# Altium footprint library 6.Transistors&Chips.PcbLib: 88 footprints (part 2 of 6)
Each footprint in its own frame and in the unit in brackets; x right, y up, seen from the top. Pads: shape width x height; smd on the part's side, far side on the other; paste and mask are expansions set on the pad; w line width, h text height; cw(c..) or ccw(c..) is an arc to the next point about the centre after c.
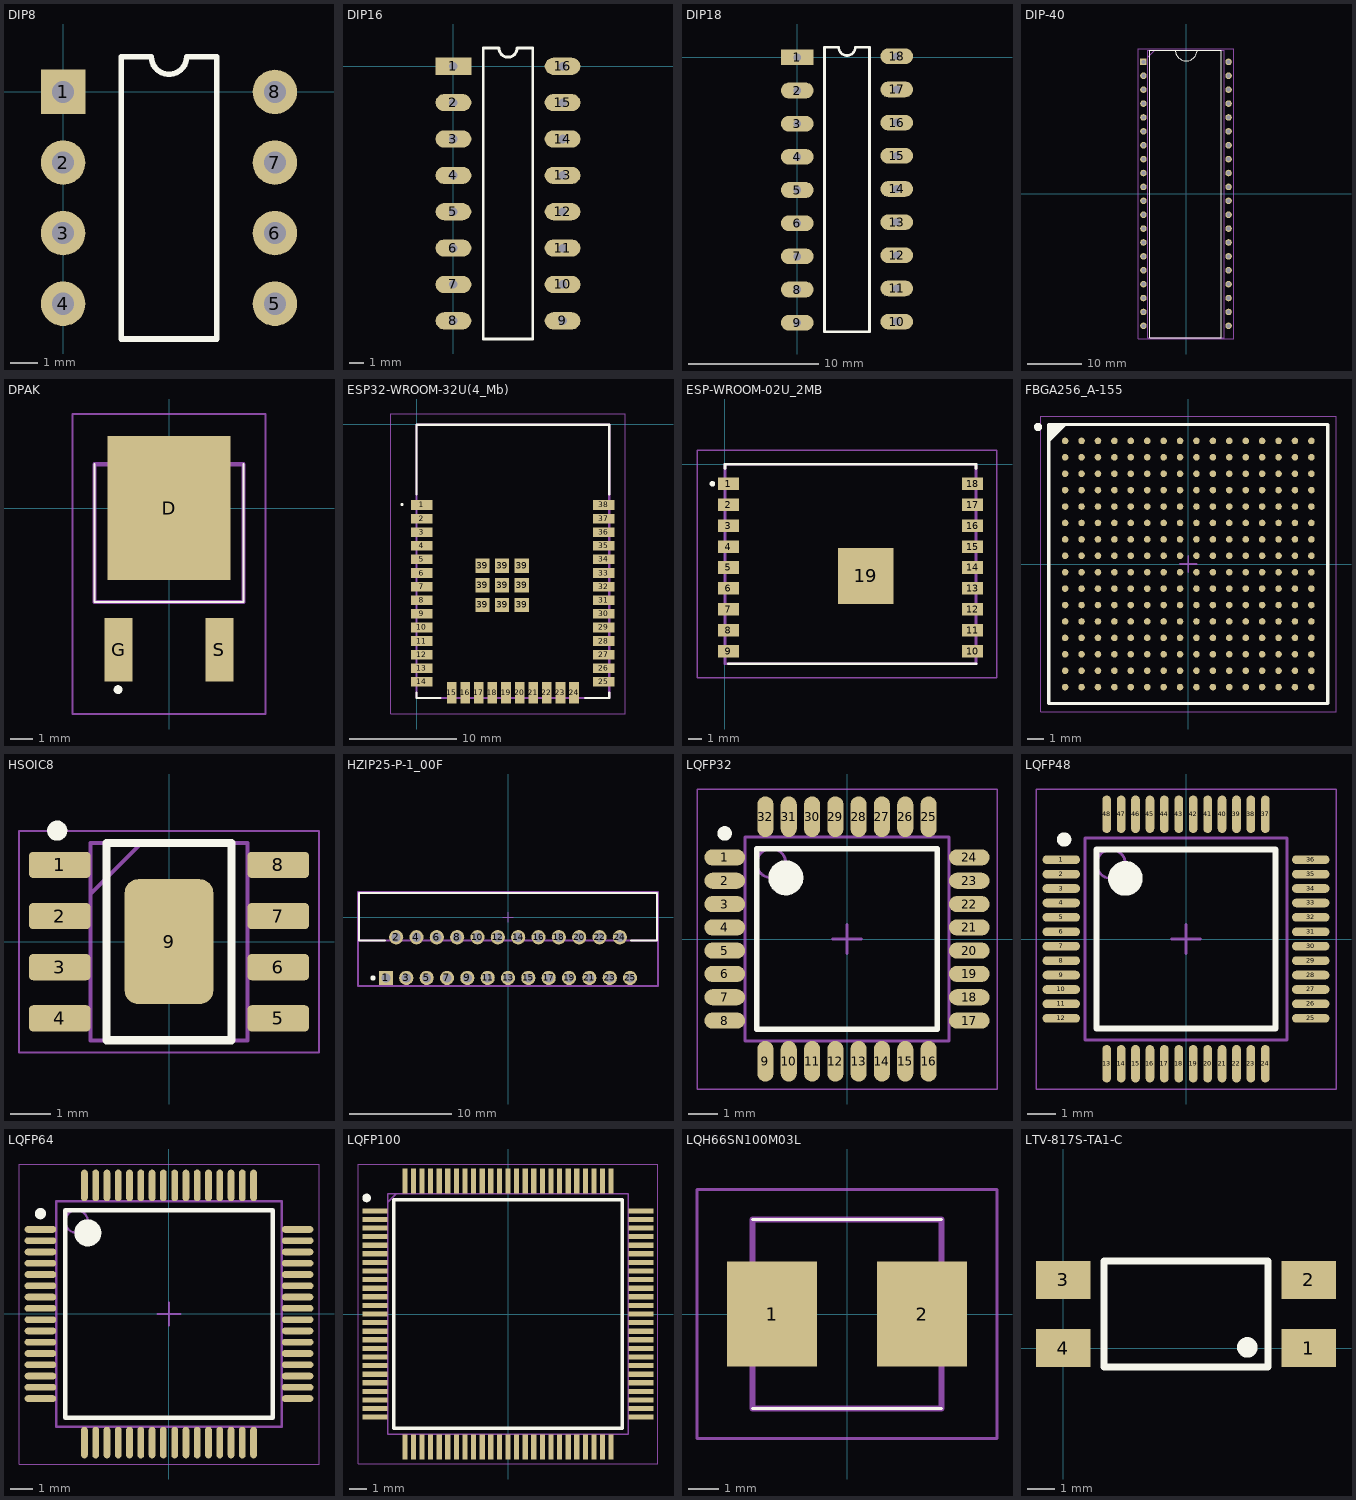
[diagram p1: the footprints below, top view; thin cyan lines are the x and y axes]

## DIP8 [mm]
pads (8):
  rect 1.6x1.6 hole 0.8: 1(0,0)
  round 1.6 hole 0.8: 2(0,-2.54) 3(0,-5.08) 4(0,-7.62) 5(7.62,-7.62) 6(7.62,-5.08) 7(7.62,-2.54) 8(7.62,0)
Top Overlay:
  lines w0.2: 2.085,-8.89 5.535,-8.89 5.535,1.27 4.445,1.27 cw(c3.81,1.27) 3.175,1.27 2.085,1.27 2.085,-8.89
3D body "CircuitWorks-DIP8.step": height 4.19, standoff -2.67, extent -0.127,-9.525 7.747,1.905

## DIP16 [mm]
pads (16):
  rect 2.5x1.2 hole 0.6: 1(0,0)
  oval 2.5x1.2 hole 0.6: 2(0,-2.54) 3(0,-5.08) 4(0,-7.62) 5(0,-10.16) 6(0,-12.7) 7(0,-15.24) 8(0,-17.78) 9(7.62,-17.78) 10(7.62,-15.24) 11(7.62,-12.7) 12(7.62,-10.16) 13(7.62,-7.62) 14(7.62,-5.08) 15(7.62,-2.54) 16(7.62,0)
Top Overlay:
  lines w0.2: 2.085,-19.05 2.085,1.27 3.175,1.27 ccw(c3.81,1.27) 4.445,1.27 5.535,1.27 5.535,-19.05 2.085,-19.05
3D body "CircuitWorks-DIP16.step": height 4.19, standoff -2.57, extent -0.137,-19.6 7.737,1.99

## DIP18 [mm]
pads (18):
  rect 2.5x1.2 hole 0.6: 1(0,0)
  oval 2.5x1.2 hole 0.6: 2(0,-2.54) 3(0,-5.08) 4(0,-7.62) 5(0,-10.16) 6(0,-12.7) 7(0,-15.24) 8(0,-17.78) 9(0,-20.32) 10(7.62,-20.24) 11(7.62,-17.7) 12(7.62,-15.16) 13(7.62,-12.62) 14(7.62,-10.08) 15(7.62,-7.54) 16(7.62,-5) 17(7.62,-2.46) 18(7.62,0.08)
Top Overlay:
  lines w0.2: 2.085,-21 5.535,-21 5.535,0.77 4.445,0.77 cw(c3.81,0.77) 3.175,0.77 2.085,0.77 2.085,-21
3D body "User Library-DIP-18P-M02.step": height 5, standoff -3, extent -0.1,-21.1 7.77,0.9

## DIP-40 [mm]
pads (40):
  rect 1.2x1.2 hole 0.75: 1(-7.779,24.13)
  round 1.2 hole 0.75: 2(-7.779,21.59) 3(-7.779,19.05) 4(-7.779,16.51) 5(-7.779,13.97) 6(-7.779,11.43) 7(-7.779,8.89) 8(-7.779,6.35) 9(-7.779,3.81) 10(-7.779,1.27) 11(-7.779,-1.27) 12(-7.779,-3.81) 13(-7.779,-6.35) 14(-7.779,-8.89) 15(-7.779,-11.43) 16(-7.779,-13.97) 17(-7.779,-16.51) 18(-7.779,-19.05) 19(-7.779,-21.59) 20(-7.779,-24.13) 21(7.779,-24.13) 22(7.779,-21.59) 23(7.779,-19.05) 24(7.779,-16.51) 25(7.779,-13.97) 26(7.779,-11.43) 27(7.779,-8.89) 28(7.779,-6.35) 29(7.779,-3.81) 30(7.779,-1.27) 31(7.779,1.27) 32(7.779,3.81) 33(7.779,6.35) 34(7.779,8.89) 35(7.779,11.43) 36(7.779,13.97) 37(7.779,16.51) 38(7.779,19.05) 39(7.779,21.59) 40(7.779,24.13)
Top Overlay:
  lines w0.2: -6.477,-26.289 -6.604,-26.289 ; -1.968,26.289 ccw(c0.032,26.318) 2.032,26.289 ; -6.604,-26.289 -6.604,26.289 6.477,26.289 6.477,-26.289 -6.604,-26.289
Mechanical 13:
  lines w0.1: -6.985,25.019 -5.715,26.289 ; -6.985,-26.289 6.985,-26.289 6.985,26.289 -6.985,26.289 -6.985,-26.289
Mechanical 15:
  lines w0.05: -8.767,-26.539 8.767,-26.539 8.767,26.539 -8.767,26.539 -8.767,-26.539
3D body "ATmega16L-8PU.stp": height 4.83, standoff -3.5, extent -7.919,-26.162 7.919,26.162

## DPAK [mm]
pads (3):
  rect 5.55x6.5 smd: D(0,0)
  rect 1.25x2.85 smd: G(-2.28,-6.4) S(2.28,-6.4)
Top Overlay:
  lines w0.1: -3.365,1.98 -3.365,-4.24 3.365,-4.24 3.365,1.98
  lines w0.2: -2.4,-8.2 cw(c-2.3,-8.2) -2.2,-8.2 cw(c-2.3,-8.2) -2.4,-8.2
Mechanical 13:
  lines w0.2: -3.365,-4.24 -3.365,1.98 3.365,1.98 3.365,-4.24 -3.365,-4.24
Mechanical 15:
  lines w0.1: -4.365,-9.3 -4.365,4.25 4.365,4.25 4.365,-9.3 -4.365,-9.3
3D body "FDD4141.stp": height 2.3, standoff 0, extent -3.25,-7.705 3.25,2.657

## ESP32-WROOM-32U(4_Mb) [mm] "DD?"
pads (47):
  rect 2x0.9 smd: 1(0.456,-7.549) 2(0.456,-8.819) 3(0.456,-10.089) 4(0.456,-11.359) 5(0.456,-12.629) 6(0.456,-13.899) 7(0.456,-15.169) 8(0.456,-16.439) 9(0.456,-17.709) 10(0.456,-18.979) 11(0.456,-20.249) 12(0.456,-21.519) 13(0.456,-22.789) 14(0.456,-24.059) 25(17.456,-24.059) 26(17.456,-22.789) 27(17.456,-21.519) 28(17.456,-20.249) 29(17.456,-18.979) 30(17.456,-17.709) 31(17.456,-16.439) 32(17.456,-15.169) 33(17.456,-13.899) 34(17.456,-12.629) 35(17.456,-11.359) 36(17.456,-10.089) 37(17.456,-8.819) 38(17.456,-7.549)
  rect 0.9x2 smd: 15(3.241,-25.059) 16(4.511,-25.059) 17(5.781,-25.059) 18(7.051,-25.059) 19(8.321,-25.059) 20(9.591,-25.059) 21(10.861,-25.059) 22(12.131,-25.059) 23(13.401,-25.059) 24(14.671,-25.059)
  rect 1.33x1.33 smd: 39(6.121,-16.884) 39(6.121,-15.049) 39(6.121,-13.214) 39(7.956,-16.884) 39(7.956,-15.049) 39(7.956,-13.214) 39(9.791,-16.884) 39(9.791,-15.049) 39(9.791,-13.214)
Top Overlay:
  lines w0.2: -1.444,-7.509 cw(c-1.394,-7.509) -1.344,-7.509 ; -1.444,-7.509 ccw(c-1.394,-7.509) -1.344,-7.509 ; -1.444,-7.509 ccw(c-1.394,-7.509) -1.344,-7.509 ; -0.044,-25.559 -0.044,-25.059 -0.044,-25.559 ; -0.044,-25.559 2.206,-25.559 -0.044,-25.559 ; -0.044,-0.059 17.956,-0.059 ; -0.044,-0.059 17.956,-0.059 ; -0.044,-0.059 -0.044,-6.559 -0.044,-0.059 ; 17.956,-25.559 17.956,-25.059 17.956,-25.559 ; 17.956,-25.559 15.706,-25.559 17.956,-25.559 ; 17.956,-0.059 17.956,-6.559 17.956,-0.059
Mechanical 13:
  lines w0.2: -0.044,-25.559 17.956,-25.559 17.956,-0.059 -0.044,-0.059 -0.044,-25.559
Mechanical 15:
  lines w0.1: -2.444,-27.059 19.456,-27.059 19.456,0.941 -2.444,0.941 -2.444,-27.059
3D body "ESP32-WROOM-32U__4MB_.stp": height 3.1, standoff 0, extent -0.044,-25.559 17.956,-0.059

## ESP-WROOM-02U_2MB [mm] "DD?"
pads (19):
  rect 1.5x0.9 smd: 1(0.25,-1.4) 2(0.25,-2.9) 3(0.25,-4.4) 4(0.25,-5.9) 5(0.25,-7.4) 6(0.25,-8.9) 7(0.25,-10.4) 8(0.25,-11.9) 9(0.25,-13.4) 10(17.75,-13.4) 11(17.75,-11.9) 12(17.75,-10.4) 13(17.75,-8.9) 14(17.75,-7.4) 15(17.75,-5.9) 16(17.75,-4.4) 17(17.75,-2.9) 18(17.75,-1.4)
  rect 4x4 smd: 19(10.1,-8.01)
Top Overlay:
  lines w0.2: 0,-0.3 0,0 17.75,0 18,0 18,-0.3 ; 0.25,-14.3 18,-14.3 ; -0.9,-1.5 cw(c-0.9,-1.4) -0.9,-1.3 cw(c-0.9,-1.4) -0.9,-1.5
Mechanical 13:
  lines w0.2: 0,-14.3 18,-14.3 18,0 0,0 0,-14.3
Mechanical 15:
  lines w0.1: -2,-15.3 19.5,-15.3 19.5,1 -2,1 -2,-15.3
3D body "User Library-ESP-WROOM-02U.STEP": height 3.28, standoff 0.05, extent -0.035,-14.3 18.035,0

## FBGA256_A-155 [mm] "BGA, 256-Leads, Body 17x17mm, Pitch 1mm"
height 1.55
pads (256):
  round 0.4 smd: A1(-7.5,7.5) A2(-6.5,7.5) A3(-5.5,7.5) A4(-4.5,7.5) A5(-3.5,7.5) A6(-2.5,7.5) A7(-1.5,7.5) A8(-0.5,7.5) A9(0.5,7.5) A10(1.5,7.5) A11(2.5,7.5) A12(3.5,7.5) A13(4.5,7.5) A14(5.5,7.5) A15(6.5,7.5) A16(7.5,7.5) B1(-7.5,6.5) B2(-6.5,6.5) B3(-5.5,6.5) B4(-4.5,6.5) B5(-3.5,6.5) B6(-2.5,6.5) B7(-1.5,6.5) B8(-0.5,6.5) B9(0.5,6.5) B10(1.5,6.5) B11(2.5,6.5) B12(3.5,6.5) B13(4.5,6.5) B14(5.5,6.5) B15(6.5,6.5) B16(7.5,6.5) C1(-7.5,5.5) C2(-6.5,5.5) C3(-5.5,5.5) C4(-4.5,5.5) C5(-3.5,5.5) C6(-2.5,5.5) C7(-1.5,5.5) C8(-0.5,5.5) C9(0.5,5.5) C10(1.5,5.5) C11(2.5,5.5) C12(3.5,5.5) C13(4.5,5.5) C14(5.5,5.5) C15(6.5,5.5) C16(7.5,5.5) D1(-7.5,4.5) D2(-6.5,4.5) D3(-5.5,4.5) D4(-4.5,4.5) D5(-3.5,4.5) D6(-2.5,4.5) D7(-1.5,4.5) D8(-0.5,4.5) D9(0.5,4.5) D10(1.5,4.5) D11(2.5,4.5) D12(3.5,4.5) D13(4.5,4.5) D14(5.5,4.5) D15(6.5,4.5) D16(7.5,4.5) E1(-7.5,3.5) E2(-6.5,3.5) E3(-5.5,3.5) E4(-4.5,3.5) E5(-3.5,3.5) E6(-2.5,3.5) E7(-1.5,3.5) E8(-0.5,3.5) E9(0.5,3.5) E10(1.5,3.5) E11(2.5,3.5) E12(3.5,3.5) E13(4.5,3.5) E14(5.5,3.5) E15(6.5,3.5) E16(7.5,3.5) F1(-7.5,2.5) F2(-6.5,2.5) F3(-5.5,2.5) F4(-4.5,2.5) F5(-3.5,2.5) F6(-2.5,2.5) F7(-1.5,2.5) F8(-0.5,2.5) F9(0.5,2.5) F10(1.5,2.5) F11(2.5,2.5) F12(3.5,2.5) F13(4.5,2.5) F14(5.5,2.5) F15(6.5,2.5) F16(7.5,2.5) G1(-7.5,1.5) G2(-6.5,1.5) G3(-5.5,1.5) G4(-4.5,1.5) G5(-3.5,1.5) G6(-2.5,1.5) G7(-1.5,1.5) G8(-0.5,1.5) G9(0.5,1.5) G10(1.5,1.5) G11(2.5,1.5) G12(3.5,1.5) G13(4.5,1.5) G14(5.5,1.5) G15(6.5,1.5) G16(7.5,1.5) H1(-7.5,0.5) H2(-6.5,0.5) H3(-5.5,0.5) H4(-4.5,0.5) H5(-3.5,0.5) H6(-2.5,0.5) H7(-1.5,0.5) H8(-0.5,0.5) H9(0.5,0.5) H10(1.5,0.5) H11(2.5,0.5) H12(3.5,0.5) H13(4.5,0.5) H14(5.5,0.5) H15(6.5,0.5) H16(7.5,0.5) J1(-7.5,-0.5) J2(-6.5,-0.5) J3(-5.5,-0.5) J4(-4.5,-0.5) J5(-3.5,-0.5) J6(-2.5,-0.5) J7(-1.5,-0.5) J8(-0.5,-0.5) J9(0.5,-0.5) J10(1.5,-0.5) J11(2.5,-0.5) J12(3.5,-0.5) J13(4.5,-0.5) J14(5.5,-0.5) J15(6.5,-0.5) J16(7.5,-0.5) K1(-7.5,-1.5) K2(-6.5,-1.5) K3(-5.5,-1.5) K4(-4.5,-1.5) K5(-3.5,-1.5) K6(-2.5,-1.5) K7(-1.5,-1.5) K8(-0.5,-1.5) K9(0.5,-1.5) K10(1.5,-1.5) K11(2.5,-1.5) K12(3.5,-1.5) K13(4.5,-1.5) K14(5.5,-1.5) K15(6.5,-1.5) K16(7.5,-1.5) L1(-7.5,-2.5) L2(-6.5,-2.5) L3(-5.5,-2.5) L4(-4.5,-2.5) L5(-3.5,-2.5) L6(-2.5,-2.5) L7(-1.5,-2.5) L8(-0.5,-2.5) L9(0.5,-2.5) L10(1.5,-2.5) L11(2.5,-2.5) L12(3.5,-2.5) L13(4.5,-2.5) L14(5.5,-2.5) L15(6.5,-2.5) L16(7.5,-2.5) M1(-7.5,-3.5) M2(-6.5,-3.5) M3(-5.5,-3.5) M4(-4.5,-3.5) M5(-3.5,-3.5) M6(-2.5,-3.5) M7(-1.5,-3.5) M8(-0.5,-3.5) M9(0.5,-3.5) M10(1.5,-3.5) M11(2.5,-3.5) M12(3.5,-3.5) M13(4.5,-3.5) M14(5.5,-3.5) M15(6.5,-3.5) M16(7.5,-3.5) N1(-7.5,-4.5) N2(-6.5,-4.5) N3(-5.5,-4.5) N4(-4.5,-4.5) N5(-3.5,-4.5) N6(-2.5,-4.5) N7(-1.5,-4.5) N8(-0.5,-4.5) N9(0.5,-4.5) N10(1.5,-4.5) N11(2.5,-4.5) N12(3.5,-4.5) N13(4.5,-4.5) N14(5.5,-4.5) N15(6.5,-4.5) N16(7.5,-4.5) P1(-7.5,-5.5) P2(-6.5,-5.5) P3(-5.5,-5.5) P4(-4.5,-5.5) P5(-3.5,-5.5) P6(-2.5,-5.5) P7(-1.5,-5.5) P8(-0.5,-5.5) P9(0.5,-5.5) P10(1.5,-5.5) P11(2.5,-5.5) P12(3.5,-5.5) P13(4.5,-5.5) P14(5.5,-5.5) P15(6.5,-5.5) P16(7.5,-5.5) R1(-7.5,-6.5) R2(-6.5,-6.5) R3(-5.5,-6.5) R4(-4.5,-6.5) R5(-3.5,-6.5) R6(-2.5,-6.5) R7(-1.5,-6.5) R8(-0.5,-6.5) R9(0.5,-6.5) R10(1.5,-6.5) R11(2.5,-6.5) R12(3.5,-6.5) R13(4.5,-6.5) R14(5.5,-6.5) R15(6.5,-6.5) R16(7.5,-6.5) T1(-7.5,-7.5) T2(-6.5,-7.5) T3(-5.5,-7.5) T4(-4.5,-7.5) T5(-3.5,-7.5) T6(-2.5,-7.5) T7(-1.5,-7.5) T8(-0.5,-7.5) T9(0.5,-7.5) T10(1.5,-7.5) T11(2.5,-7.5) T12(3.5,-7.5) T13(4.5,-7.5) T14(5.5,-7.5) T15(6.5,-7.5) T16(7.5,-7.5)
Top Overlay:
  circle w0.25: c-9.15,8.35 r0.125
  region: -7.5,8.5 -8.5,7.5 -8.5,8.5
  lines w0.2: -8.5,7.5 -7.5,8.5 ; -8.5,-8.5 8.5,-8.5 8.5,8.5 -8.5,8.5 -8.5,-8.5
Mechanical 13:
  lines w0.1: -8.5,-8.5 8.5,-8.5 8.5,8.5 -8.5,8.5 -8.5,-8.5
Mechanical 15:
  lines w0.05: -9,-9 9,-9 9,9 -9,9 -9,-9
  lines w0.1: -0.5,0 0.5,0 ; 0,-0.5 0,0.5
3D body: height 1.55, standoff 0, extent -8.5,-8.5 8.5,8.5

## HSOIC8 [mm]
pads (9):
  rrect30% 1.525x0.65 smd: 1(-2.712,1.905) 2(-2.712,0.635) 3(-2.712,-0.635) 4(-2.712,-1.905) 5(2.712,-1.905) 6(2.712,-0.635) 7(2.712,0.635) 8(2.712,1.905)
  rrect30% 2.2x3.1 smd: 9(0,0)
Top Overlay:
  circle w0.25: c-2.775,2.755 r0.125
  lines w0.2: -1.55,-2.45 1.55,-2.45 1.55,2.45 -1.55,2.45 -1.55,-2.45
Mechanical 13:
  lines w0.1: -1.95,1.18 -0.68,2.45 ; -1.95,-2.45 -1.95,2.45 1.95,2.45 1.95,-2.45 -1.95,-2.45
Mechanical 15:
  lines w0.05: -3.725,-2.75 -3.725,2.75 3.725,2.75 3.725,-2.75 -3.725,-2.75
3D body "ST1S41PHR.stp": height 1.7, standoff 0, extent -3,-2.45 3,2.45

## HZIP25-P-1_00F [mm]
pads (25):
  rect 1.4x1.4 hole 0.9 paste-2539.97 mask+0: 1(-12,-5.95)
  round 1.4 hole 0.9 paste-2539.97 mask+0: 2(-11,-1.95) 3(-10,-5.95) 4(-9,-1.95) 5(-8,-5.95) 6(-7,-1.95) 7(-6,-5.95) 8(-5,-1.95) 9(-4,-5.95) 10(-3,-1.95) 11(-2,-5.95) 12(-1,-1.95) 13(0,-5.95) 14(1,-1.95) 15(2,-5.95) 16(3,-1.95) 17(4,-5.95) 18(5,-1.95) 19(6,-5.95) 20(7,-1.95) 21(8,-5.95) 22(9,-1.95) 23(10,-5.95) 24(11,-1.95) 25(12,-5.95)
Top Overlay:
  circle w0.25: c-13.275,-5.95 r0.125
  lines w0.2: -12.075,-2.25 -14.65,-2.25 -14.65,2.4 14.65,2.4 14.65,-2.25 12.075,-2.25
Mechanical 2:
  lines w0.2: -14.65,-2.25 -14.65,2.4 14.65,2.4 14.65,-2.25 -14.65,-2.25
Mechanical 3:
  lines w0.2: -14.75,-6.75 -14.75,2.5 14.75,2.5 14.75,-6.75 -14.75,-6.75
Mechanical 5:
  lines w0.2: -14.75,-6.75 -14.75,2.5 14.75,2.5 14.75,-6.75 -14.75,-6.75
  text ".Designator" at 0,-2.125 h1
Mechanical 16:
  lines w0.1: -0.5,0 0.5,0 ; 0,-0.5 0,0.5
3D body "IC_Toshiba_TB6600HG_O_eec.STEP": height 0.25, standoff 0, extent -14.75,-6.75 14.75,2.5

## LQFP32 [mm] "TQFP, 32-Leads, Body 7.00x7.00mm, Pitch 0.80mm, IPC Medium Density"
height 1.6
pads (32):
  oval 1.4x0.55 smd: 1(-4.2,2.8) 2(-4.2,2) 3(-4.2,1.2) 4(-4.2,0.4) 5(-4.2,-0.4) 6(-4.2,-1.2) 7(-4.2,-2) 8(-4.2,-2.8) 17(4.2,-2.8) 18(4.2,-2) 19(4.2,-1.2) 20(4.2,-0.4) 21(4.2,0.4) 22(4.2,1.2) 23(4.2,2) 24(4.2,2.8)
  oval 0.55x1.4 smd: 9(-2.8,-4.2) 10(-2,-4.2) 11(-1.2,-4.2) 12(-0.4,-4.2) 13(0.4,-4.2) 14(1.2,-4.2) 15(2,-4.2) 16(2.8,-4.2) 25(2.8,4.2) 26(2,4.2) 27(1.2,4.2) 28(0.4,4.2) 29(-0.4,4.2) 30(-1.2,4.2) 31(-2,4.2) 32(-2.8,4.2)
Top Overlay:
  circle w0.25: c-4.2,3.625 r0.125
  circle w0.6: c-2.1,2.1 r0.3
  lines w0.2: -3.1,-3.1 -3.1,3.1 3.1,3.1 3.1,-3.1 -3.1,-3.1
Mechanical 13:
  circle w0.1: c-2.6,2.6 r0.5
  lines w0.1: -3.5,-3.5 -3.5,3.5 3.5,3.5 3.5,-3.5 -3.5,-3.5
Mechanical 15:
  lines w0.05: -5.15,-5.15 -5.15,5.15 5.15,5.15 5.15,-5.15 -5.15,-5.15
  lines w0.1: -0.5,0 0.5,0 ; 0,-0.5 0,0.5
3D body "TQFP80P900X900X160-32N.step": height 1.6, standoff 0, extent -4.5,-4.5 4.5,4.5

## LQFP48 [mm] "TSQFP, 48-Leads, Body 7,00x7,00mm, Pitch 0,50mm, IPC Medium Density"
height 1.54
pads (48):
  oval 1.3x0.3 smd: 1(-4.325,2.75) 2(-4.325,2.25) 3(-4.325,1.75) 4(-4.325,1.25) 5(-4.325,0.75) 6(-4.325,0.25) 7(-4.325,-0.25) 8(-4.325,-0.75) 9(-4.325,-1.25) 10(-4.325,-1.75) 11(-4.325,-2.25) 12(-4.325,-2.75) 25(4.325,-2.75) 26(4.325,-2.25) 27(4.325,-1.75) 28(4.325,-1.25) 29(4.325,-0.75) 30(4.325,-0.25) 31(4.325,0.25) 32(4.325,0.75) 33(4.325,1.25) 34(4.325,1.75) 35(4.325,2.25) 36(4.325,2.75)
  oval 0.3x1.3 smd: 13(-2.75,-4.325) 14(-2.25,-4.325) 15(-1.75,-4.325) 16(-1.25,-4.325) 17(-0.75,-4.325) 18(-0.25,-4.325) 19(0.25,-4.325) 20(0.75,-4.325) 21(1.25,-4.325) 22(1.75,-4.325) 23(2.25,-4.325) 24(2.75,-4.325) 37(2.75,4.325) 38(2.25,4.325) 39(1.75,4.325) 40(1.25,4.325) 41(0.75,4.325) 42(0.25,4.325) 43(-0.25,4.325) 44(-0.75,4.325) 45(-1.25,4.325) 46(-1.75,4.325) 47(-2.25,4.325) 48(-2.75,4.325)
Top Overlay:
  circle w0.6: c-2.1,2.1 r0.3
  circle w0.25: c-4.225,3.45 r0.125
  lines w0.2: -3.1,-3.1 3.1,-3.1 3.1,3.1 -3.1,3.1 -3.1,-3.1
Top Solder:
  pour cut-out: -3,5.075 3,5.075 3,3.575 -3,3.575
  pour cut-out: -5.075,-3 -5.075,3 -3.575,3 -3.575,-3
  pour cut-out: 3,-5.075 -3,-5.075 -3,-3.575 3,-3.575
  pour cut-out: 5.075,3 5.075,-3 3.575,-3 3.575,3
Mechanical 13:
  circle w0.1: c-2.6,2.6 r0.5
  lines w0.1: -3.5,-3.5 3.5,-3.5 3.5,3.5 -3.5,3.5 -3.5,-3.5
Mechanical 15:
  lines w0.05: -5.2,-5.2 5.2,-5.2 5.2,5.2 -5.2,5.2 -5.2,-5.2
  lines w0.1: -0.5,0 0.5,0 ; 0,-0.5 0,0.5
3D body "User Library-LQFP48.step": height 1.5, standoff 0, extent -4.525,-4.525 4.475,4.475

## LQFP64 [mm] "TSQFP, 64-Leads, Body 10.00x10.00mm, Pitch 0.50mm, IPC Medium Density"
height 1.6
pads (64):
  oval 1.4x0.3 smd: 1(-5.7,3.75) 2(-5.7,3.25) 3(-5.7,2.75) 4(-5.7,2.25) 5(-5.7,1.75) 6(-5.7,1.25) 7(-5.7,0.75) 8(-5.7,0.25) 9(-5.7,-0.25) 10(-5.7,-0.75) 11(-5.7,-1.25) 12(-5.7,-1.75) 13(-5.7,-2.25) 14(-5.7,-2.75) 15(-5.7,-3.25) 16(-5.7,-3.75) 33(5.7,-3.75) 34(5.7,-3.25) 35(5.7,-2.75) 36(5.7,-2.25) 37(5.7,-1.75) 38(5.7,-1.25) 39(5.7,-0.75) 40(5.7,-0.25) 41(5.7,0.25) 42(5.7,0.75) 43(5.7,1.25) 44(5.7,1.75) 45(5.7,2.25) 46(5.7,2.75) 47(5.7,3.25) 48(5.7,3.75)
  oval 0.3x1.4 smd: 17(-3.75,-5.7) 18(-3.25,-5.7) 19(-2.75,-5.7) 20(-2.25,-5.7) 21(-1.75,-5.7) 22(-1.25,-5.7) 23(-0.75,-5.7) 24(-0.25,-5.7) 25(0.25,-5.7) 26(0.75,-5.7) 27(1.25,-5.7) 28(1.75,-5.7) 29(2.25,-5.7) 30(2.75,-5.7) 31(3.25,-5.7) 32(3.75,-5.7) 49(3.75,5.7) 50(3.25,5.7) 51(2.75,5.7) 52(2.25,5.7) 53(1.75,5.7) 54(1.25,5.7) 55(0.75,5.7) 56(0.25,5.7) 57(-0.25,5.7) 58(-0.75,5.7) 59(-1.25,5.7) 60(-1.75,5.7) 61(-2.25,5.7) 62(-2.75,5.7) 63(-3.25,5.7) 64(-3.75,5.7)
Top Overlay:
  circle w0.25: c-5.7,4.45 r0.125
  circle w0.6: c-3.6,3.6 r0.3
  lines w0.2: -4.6,-4.6 -4.6,4.6 4.6,4.6 4.6,-4.6 -4.6,-4.6
Mechanical 13:
  circle w0.1: c-4.1,4.1 r0.5
  lines w0.1: -5,-5 -5,5 5,5 5,-5 -5,-5
Mechanical 15:
  lines w0.05: -6.65,-6.65 -6.65,6.65 6.65,6.65 6.65,-6.65 -6.65,-6.65
  lines w0.1: -0.5,0 0.5,0 ; 0,-0.5 0,0.5
3D body "TSQFP50P1200X1200X160-64N.step": height 1.6, standoff 0, extent -6,-6 6,6

## LQFP100 [mm]
pads (100):
  rect 1.475x0.3 smd: 1(-7.738,6) 2(-7.738,5.5) 3(-7.738,5) 4(-7.738,4.5) 5(-7.738,4) 6(-7.738,3.5) 7(-7.738,3) 8(-7.738,2.5) 9(-7.738,2) 10(-7.738,1.5) 11(-7.738,1) 12(-7.738,0.5) 13(-7.738,0) 14(-7.738,-0.5) 15(-7.738,-1) 16(-7.738,-1.5) 17(-7.738,-2) 18(-7.738,-2.5) 19(-7.738,-3) 20(-7.738,-3.5) 21(-7.738,-4) 22(-7.738,-4.5) 23(-7.738,-5) 24(-7.738,-5.5) 25(-7.738,-6) 51(7.738,-6) 52(7.738,-5.5) 53(7.738,-5) 54(7.738,-4.5) 55(7.738,-4) 56(7.738,-3.5) 57(7.738,-3) 58(7.738,-2.5) 59(7.738,-2) 60(7.738,-1.5) 61(7.738,-1) 62(7.738,-0.5) 63(7.738,0) 64(7.738,0.5) 65(7.738,1) 66(7.738,1.5) 67(7.738,2) 68(7.738,2.5) 69(7.738,3) 70(7.738,3.5) 71(7.738,4) 72(7.738,4.5) 73(7.738,5) 74(7.738,5.5) 75(7.738,6)
  rect 0.3x1.475 smd: 26(-6,-7.738) 27(-5.5,-7.738) 28(-5,-7.738) 29(-4.5,-7.738) 30(-4,-7.738) 31(-3.5,-7.738) 32(-3,-7.738) 33(-2.5,-7.738) 34(-2,-7.738) 35(-1.5,-7.738) 36(-1,-7.738) 37(-0.5,-7.738) 38(0,-7.738) 39(0.5,-7.738) 40(1,-7.738) 41(1.5,-7.738) 42(2,-7.738) 43(2.5,-7.738) 44(3,-7.738) 45(3.5,-7.738) 46(4,-7.738) 47(4.5,-7.738) 48(5,-7.738) 49(5.5,-7.738) 50(6,-7.738) 76(6,7.738) 77(5.5,7.738) 78(5,7.738) 79(4.5,7.738) 80(4,7.738) 81(3.5,7.738) 82(3,7.738) 83(2.5,7.738) 84(2,7.738) 85(1.5,7.738) 86(1,7.738) 87(0.5,7.738) 88(0,7.738) 89(-0.5,7.738) 90(-1,7.738) 91(-1.5,7.738) 92(-2,7.738) 93(-2.5,7.738) 94(-3,7.738) 95(-3.5,7.738) 96(-4,7.738) 97(-4.5,7.738) 98(-5,7.738) 99(-5.5,7.738) 100(-6,7.738)
Top Overlay:
  circle w0.25: c-8.225,6.75 r0.125
  lines w0.2: -6.65,-6.65 6.65,-6.65 6.65,6.65 -6.65,6.65 -6.65,-6.65
Mechanical 13:
  lines w0.1: -7,6.5 -6.5,7 ; -7,-7 7,-7 7,7 -7,7 -7,-7
Mechanical 15:
  lines w0.05: -8.725,-8.725 8.725,-8.725 8.725,8.725 -8.725,8.725 -8.725,-8.725
3D body "STM32F746VGT6.stp": height 1.6, standoff 0, extent -8,-8 8,8

## LQH66SN100M03L [mm]
pads (2):
  rect 3x3.5 smd: 1(-2.5,0) 2(2.5,0)
Top Overlay:
  lines w0.1: -3.15,-3.15 3.15,-3.15 ; -3.15,3.15 3.15,3.15
Mechanical 13:
  lines w0.2: -3.15,-3.15 3.15,-3.15 3.15,3.15 -3.15,3.15 -3.15,-3.15
Mechanical 15:
  lines w0.1: -5,-4.15 5,-4.15 5,4.15 -5,4.15 -5,-4.15
3D body "LQH66SN471M03K.stp": height 4.7, standoff 0, extent -3.15,-3.15 3.15,3.15

## LTV-817S-TA1-C [mm]
pads (4):
  rect 2x1.4 smd: 1(9,0) 2(9,2.5) 3(0,2.5) 4(0,0)
Top Overlay:
  circle w0.5: c6.75,0.025 r0.125
  lines w0.254: 1.5,-0.7 7.5,-0.7 7.5,3.2 1.5,3.2 1.5,-0.7